# Altium schematic symbol library jlcpcb_2025_04_resistors_extended_2512.schlib: 2667 symbols (part 1 of 14) (continued)
## 25121WF220JT4E
designator R?  Resistance: 22Ω  (hidden comment: *)
Resistor, 22Ω, ±1%, 1W, 200V, ±200ppm/℃, -55℃~+155℃, SMD 2512; Manufacturer: Uniroyal; Manufacturer Part Number: 25121WF220JT4E; Supplier 1: LCSC; Supplier Part Number 1: C118189; JLCPCB Part Number: C118189; Power Rating: 1W; Category: Resistors; Package Size: 2512; JLCPCB Basic Part: Yes; Tolerance: ±1%; Voltage Rating: 200V; Temperature Coefficient: ±200ppm/℃; Temperature Rating: -55℃~+155℃; ComponentLink1Description: Datasheet; ComponentLink1URL: https://wmsc.lcsc.com/wmsc/upload/file/pdf/v2/lcsc/2205312316_UNI-ROYAL-Uniroyal-Elec-25121WF220JT4E_C118189.pdf; ComponentLink2Description: JLCPCB Part URL; ComponentLink2URL: https://jlcpcb.com/partdetail/C118189
pins: 1, 2
1 alternate drawing of the same symbol

## 25121WF220KT4E
designator R?  Resistance: 2.2Ω  (hidden comment: *)
Resistor, 2.2Ω, ±1%, 1W, 200V, ±200ppm/℃, -55℃~+155℃, SMD 2512; Manufacturer: Uniroyal; Manufacturer Part Number: 25121WF220KT4E; Supplier 1: LCSC; Supplier Part Number 1: C620867; JLCPCB Part Number: C620867; Power Rating: 1W; Category: Resistors; Package Size: 2512; JLCPCB Basic Part: Yes; Tolerance: ±1%; Voltage Rating: 200V; Temperature Coefficient: ±200ppm/℃; Temperature Rating: -55℃~+155℃; ComponentLink1Description: Datasheet; ComponentLink1URL: https://wmsc.lcsc.com/wmsc/upload/file/pdf/v2/lcsc/2205311816_UNI-ROYAL-Uniroyal-Elec-25121WF220KT4E_C620867.pdf; ComponentLink2Description: JLCPCB Part URL; ComponentLink2URL: https://jlcpcb.com/partdetail/C620867
pins: 1, 2
1 alternate drawing of the same symbol

## 25121WF220MT4E
designator R?  Resistance: 22mΩ  (hidden comment: *)
Resistor, 22mΩ, ±1%, 1W, 200V, ±1000ppm/℃, -55℃~+155℃, SMD 2512; Manufacturer: Uniroyal; Manufacturer Part Number: 25121WF220MT4E; Supplier 1: LCSC; Supplier Part Number 1: C921013; JLCPCB Part Number: C921013; Power Rating: 1W; Category: Resistors; Package Size: 2512; JLCPCB Basic Part: Yes; Tolerance: ±1%; Voltage Rating: 200V; Temperature Coefficient: ±1000ppm/℃; Temperature Rating: -55℃~+155℃; ComponentLink1Description: Datasheet; ComponentLink1URL: https://wmsc.lcsc.com/wmsc/upload/file/pdf/v2/lcsc/2206011045_UNI-ROYAL-Uniroyal-Elec-25121WF220MT4E_C921013.pdf; ComponentLink2Description: JLCPCB Part URL; ComponentLink2URL: https://jlcpcb.com/partdetail/C921013
pins: 1, 2
1 alternate drawing of the same symbol

## 25121WF221JT4E
designator R?  Resistance: 22.1Ω  (hidden comment: *)
Resistor, 22.1Ω, ±1%, 1W, 200V, ±100ppm/℃, -55℃~+155℃, SMD 2512; Manufacturer: Uniroyal; Manufacturer Part Number: 25121WF221JT4E; Supplier 1: LCSC; Supplier Part Number 1: C421606; JLCPCB Part Number: C421606; Power Rating: 1W; Category: Resistors; Package Size: 2512; JLCPCB Basic Part: Yes; Tolerance: ±1%; Voltage Rating: 200V; Temperature Coefficient: ±100ppm/℃; Temperature Rating: -55℃~+155℃; ComponentLink1Description: Datasheet; ComponentLink1URL: https://wmsc.lcsc.com/wmsc/upload/file/pdf/v2/lcsc/2205312000_UNI-ROYAL-Uniroyal-Elec-25121WF221JT4E_C421606.pdf; ComponentLink2Description: JLCPCB Part URL; ComponentLink2URL: https://jlcpcb.com/partdetail/C421606
pins: 1, 2
1 alternate drawing of the same symbol

## 25121WF232JT4E
designator R?  Resistance: 23.2Ω  (hidden comment: *)
Resistor, 23.2Ω, ±1%, 1W, 200V, ±100ppm/℃, -55℃~+155℃, SMD 2512; Manufacturer: Uniroyal; Manufacturer Part Number: 25121WF232JT4E; Supplier 1: LCSC; Supplier Part Number 1: C421603; JLCPCB Part Number: C421603; Power Rating: 1W; Category: Resistors; Package Size: 2512; JLCPCB Basic Part: Yes; Tolerance: ±1%; Voltage Rating: 200V; Temperature Coefficient: ±100ppm/℃; Temperature Rating: -55℃~+155℃; ComponentLink1Description: Datasheet; ComponentLink1URL: https://wmsc.lcsc.com/wmsc/upload/file/pdf/v2/lcsc/2205312000_UNI-ROYAL-Uniroyal-Elec-25121WF232JT4E_C421603.pdf; ComponentLink2Description: JLCPCB Part URL; ComponentLink2URL: https://jlcpcb.com/partdetail/C421603
pins: 1, 2
1 alternate drawing of the same symbol

## 25121WF237JT4E
designator R?  Resistance: 23.7Ω  (hidden comment: *)
Resistor, 23.7Ω, ±1%, 1W, 200V, ±100ppm/℃, -55℃~+155℃, SMD 2512; Manufacturer: Uniroyal; Manufacturer Part Number: 25121WF237JT4E; Supplier 1: LCSC; Supplier Part Number 1: C421601; JLCPCB Part Number: C421601; Power Rating: 1W; Category: Resistors; Package Size: 2512; JLCPCB Basic Part: Yes; Tolerance: ±1%; Voltage Rating: 200V; Temperature Coefficient: ±100ppm/℃; Temperature Rating: -55℃~+155℃; ComponentLink1Description: Datasheet; ComponentLink1URL: https://wmsc.lcsc.com/wmsc/upload/file/pdf/v2/lcsc/2205312000_UNI-ROYAL-Uniroyal-Elec-25121WF237JT4E_C421601.pdf; ComponentLink2Description: JLCPCB Part URL; ComponentLink2URL: https://jlcpcb.com/partdetail/C421601
pins: 1, 2
1 alternate drawing of the same symbol

## 25121WF240JT4E
designator R?  Resistance: 24Ω  (hidden comment: *)
Resistor, 24Ω, ±1%, 1W, 200V, ±200ppm/℃, -55℃~+155℃, SMD 2512; Manufacturer: Uniroyal; Manufacturer Part Number: 25121WF240JT4E; Supplier 1: LCSC; Supplier Part Number 1: C107659; JLCPCB Part Number: C107659; Power Rating: 1W; Category: Resistors; Package Size: 2512; JLCPCB Basic Part: Yes; Tolerance: ±1%; Voltage Rating: 200V; Temperature Coefficient: ±200ppm/℃; Temperature Rating: -55℃~+155℃; ComponentLink1Description: Datasheet; ComponentLink1URL: https://wmsc.lcsc.com/wmsc/upload/file/pdf/v2/lcsc/2205312316_UNI-ROYAL-Uniroyal-Elec-25121WF240JT4E_C107659.pdf; ComponentLink2Description: JLCPCB Part URL; ComponentLink2URL: https://jlcpcb.com/partdetail/C107659
pins: 1, 2
1 alternate drawing of the same symbol

## 25121WF240KT4E
designator R?  Resistance: 2.4Ω  (hidden comment: *)
Resistor, 2.4Ω, ±1%, 1W, 200V, ±200ppm/℃, -55℃~+155℃, SMD 2512; Manufacturer: Uniroyal; Manufacturer Part Number: 25121WF240KT4E; Supplier 1: LCSC; Supplier Part Number 1: C620868; JLCPCB Part Number: C620868; Power Rating: 1W; Category: Resistors; Package Size: 2512; JLCPCB Basic Part: Yes; Tolerance: ±1%; Voltage Rating: 200V; Temperature Coefficient: ±200ppm/℃; Temperature Rating: -55℃~+155℃; ComponentLink1Description: Datasheet; ComponentLink1URL: https://wmsc.lcsc.com/wmsc/upload/file/pdf/v2/lcsc/2205311816_UNI-ROYAL-Uniroyal-Elec-25121WF240KT4E_C620868.pdf; ComponentLink2Description: JLCPCB Part URL; ComponentLink2URL: https://jlcpcb.com/partdetail/C620868
pins: 1, 2
1 alternate drawing of the same symbol

## 25121WF249JT4E
designator R?  Resistance: 24.9Ω  (hidden comment: *)
Resistor, 24.9Ω, ±1%, 1W, 200V, ±100ppm/℃, -55℃~+155℃, SMD 2512; Manufacturer: Uniroyal; Manufacturer Part Number: 25121WF249JT4E; Supplier 1: LCSC; Supplier Part Number 1: C421595; JLCPCB Part Number: C421595; Power Rating: 1W; Category: Resistors; Package Size: 2512; JLCPCB Basic Part: Yes; Tolerance: ±1%; Voltage Rating: 200V; Temperature Coefficient: ±100ppm/℃; Temperature Rating: -55℃~+155℃; ComponentLink1Description: Datasheet; ComponentLink1URL: https://wmsc.lcsc.com/wmsc/upload/file/pdf/v2/lcsc/2205312000_UNI-ROYAL-Uniroyal-Elec-25121WF249JT4E_C421595.pdf; ComponentLink2Description: JLCPCB Part URL; ComponentLink2URL: https://jlcpcb.com/partdetail/C421595
pins: 1, 2
1 alternate drawing of the same symbol

## 25121WF250LT4E
designator R?  Resistance: 250mΩ  (hidden comment: *)
Resistor, 250mΩ, ±1%, 1W, 200V, ±800ppm/℃, -55℃~+155℃, SMD 2512; Manufacturer: Uniroyal; Manufacturer Part Number: 25121WF250LT4E; Supplier 1: LCSC; Supplier Part Number 1: C25467; JLCPCB Part Number: C25467; Power Rating: 1W; Category: Resistors; Package Size: 2512; JLCPCB Basic Part: Yes; Tolerance: ±1%; Voltage Rating: 200V; Temperature Coefficient: ±800ppm/℃; Temperature Rating: -55℃~+155℃; ComponentLink1Description: Datasheet; ComponentLink1URL: https://wmsc.lcsc.com/wmsc/upload/file/pdf/v2/lcsc/2205311845_UNI-ROYAL-Uniroyal-Elec-25121WF250LT4E_C25467.pdf; ComponentLink2Description: JLCPCB Part URL; ComponentLink2URL: https://jlcpcb.com/partdetail/C25467
pins: 1, 2
1 alternate drawing of the same symbol

## 25121WF255KT4E
designator R?  Resistance: 2.55Ω  (hidden comment: *)
Resistor, 2.55Ω, ±1%, 1W, 200V, ±400ppm/℃, -55℃~+155℃, SMD 2512; Manufacturer: Uniroyal; Manufacturer Part Number: 25121WF255KT4E; Supplier 1: LCSC; Supplier Part Number 1: C406948; JLCPCB Part Number: C406948; Power Rating: 1W; Category: Resistors; Package Size: 2512; JLCPCB Basic Part: Yes; Tolerance: ±1%; Voltage Rating: 200V; Temperature Coefficient: ±400ppm/℃; Temperature Rating: -55℃~+155℃; ComponentLink1Description: Datasheet; ComponentLink1URL: https://wmsc.lcsc.com/wmsc/upload/file/pdf/v2/lcsc/2205312300_UNI-ROYAL-Uniroyal-Elec-25121WF255KT4E_C406948.pdf; ComponentLink2Description: JLCPCB Part URL; ComponentLink2URL: https://jlcpcb.com/partdetail/C406948
pins: 1, 2
1 alternate drawing of the same symbol

## 25121WF270JT4E
designator R?  Resistance: 27Ω  (hidden comment: *)
Resistor, 27Ω, ±1%, 1W, 200V, ±100ppm/℃, -55℃~+155℃, SMD 2512; Manufacturer: Uniroyal; Manufacturer Part Number: 25121WF270JT4E; Supplier 1: LCSC; Supplier Part Number 1: C620875; JLCPCB Part Number: C620875; Power Rating: 1W; Category: Resistors; Package Size: 2512; JLCPCB Basic Part: Yes; Tolerance: ±1%; Voltage Rating: 200V; Temperature Coefficient: ±100ppm/℃; Temperature Rating: -55℃~+155℃; ComponentLink1Description: Datasheet; ComponentLink1URL: https://wmsc.lcsc.com/wmsc/upload/file/pdf/v2/lcsc/2205311816_UNI-ROYAL-Uniroyal-Elec-25121WF270JT4E_C620875.pdf; ComponentLink2Description: JLCPCB Part URL; ComponentLink2URL: https://jlcpcb.com/partdetail/C620875
pins: 1, 2
1 alternate drawing of the same symbol

## 25121WF270KT4E
designator R?  Resistance: 2.7Ω  (hidden comment: *)
Resistor, 2.7Ω, ±1%, 1W, 200V, ±200ppm/℃, -55℃~+155℃, SMD 2512; Manufacturer: Uniroyal; Manufacturer Part Number: 25121WF270KT4E; Supplier 1: LCSC; Supplier Part Number 1: C620870; JLCPCB Part Number: C620870; Power Rating: 1W; Category: Resistors; Package Size: 2512; JLCPCB Basic Part: Yes; Tolerance: ±1%; Voltage Rating: 200V; Temperature Coefficient: ±200ppm/℃; Temperature Rating: -55℃~+155℃; ComponentLink1Description: Datasheet; ComponentLink1URL: https://wmsc.lcsc.com/wmsc/upload/file/pdf/v2/lcsc/2205311816_UNI-ROYAL-Uniroyal-Elec-25121WF270KT4E_C620870.pdf; ComponentLink2Description: JLCPCB Part URL; ComponentLink2URL: https://jlcpcb.com/partdetail/C620870
pins: 1, 2
1 alternate drawing of the same symbol

## 25121WF270LT4E
designator R?  Resistance: 270mΩ  (hidden comment: *)
Resistor, 270mΩ, ±1%, 1W, 200V, ±800ppm/℃, -55℃~+155℃, SMD 2512; Manufacturer: Uniroyal; Manufacturer Part Number: 25121WF270LT4E; Supplier 1: LCSC; Supplier Part Number 1: C474286; JLCPCB Part Number: C474286; Power Rating: 1W; Category: Resistors; Package Size: 2512; JLCPCB Basic Part: Yes; Tolerance: ±1%; Voltage Rating: 200V; Temperature Coefficient: ±800ppm/℃; Temperature Rating: -55℃~+155℃; ComponentLink1Description: Datasheet; ComponentLink1URL: https://wmsc.lcsc.com/wmsc/upload/file/pdf/v2/lcsc/2206011100_UNI-ROYAL-Uniroyal-Elec-25121WF270LT4E_C474286.pdf; ComponentLink2Description: JLCPCB Part URL; ComponentLink2URL: https://jlcpcb.com/partdetail/C474286
pins: 1, 2
1 alternate drawing of the same symbol

## 25121WF280KT4E
designator R?  Resistance: 2.8Ω  (hidden comment: *)
Resistor, 2.8Ω, ±1%, 1W, 200V, ±200ppm/℃, -55℃~+155℃, SMD 2512; Manufacturer: Uniroyal; Manufacturer Part Number: 25121WF280KT4E; Supplier 1: LCSC; Supplier Part Number 1: C784337; JLCPCB Part Number: C784337; Power Rating: 1W; Category: Resistors; Package Size: 2512; JLCPCB Basic Part: Yes; Tolerance: ±1%; Voltage Rating: 200V; Temperature Coefficient: ±200ppm/℃; Temperature Rating: -55℃~+155℃; ComponentLink1Description: Datasheet; ComponentLink1URL: https://wmsc.lcsc.com/wmsc/upload/file/pdf/v2/lcsc/2206011045_UNI-ROYAL-Uniroyal-Elec-25121WF280KT4E_C784337.pdf; ComponentLink2Description: JLCPCB Part URL; ComponentLink2URL: https://jlcpcb.com/partdetail/C784337
pins: 1, 2
1 alternate drawing of the same symbol

## 25121WF280LT4E
designator R?  Resistance: 280mΩ  (hidden comment: *)
Resistor, 280mΩ, ±1%, 1W, 200V, ±800ppm/℃, -55℃~+155℃, SMD 2512; Manufacturer: Uniroyal; Manufacturer Part Number: 25121WF280LT4E; Supplier 1: LCSC; Supplier Part Number 1: C421584; JLCPCB Part Number: C421584; Power Rating: 1W; Category: Resistors; Package Size: 2512; JLCPCB Basic Part: Yes; Tolerance: ±1%; Voltage Rating: 200V; Temperature Coefficient: ±800ppm/℃; Temperature Rating: -55℃~+155℃; ComponentLink1Description: Datasheet; ComponentLink1URL: https://wmsc.lcsc.com/wmsc/upload/file/pdf/v2/lcsc/2205312000_UNI-ROYAL-Uniroyal-Elec-25121WF280LT4E_C421584.pdf; ComponentLink2Description: JLCPCB Part URL; ComponentLink2URL: https://jlcpcb.com/partdetail/C421584
pins: 1, 2
1 alternate drawing of the same symbol

## 25121WF300JT4E
designator R?  Resistance: 30Ω  (hidden comment: *)
Resistor, 30Ω, ±1%, 1W, 200V, ±100ppm/℃, -55℃~+155℃, SMD 2512; Manufacturer: Uniroyal; Manufacturer Part Number: 25121WF300JT4E; Supplier 1: LCSC; Supplier Part Number 1: C620878; JLCPCB Part Number: C620878; Power Rating: 1W; Category: Resistors; Package Size: 2512; JLCPCB Basic Part: Yes; Tolerance: ±1%; Voltage Rating: 200V; Temperature Coefficient: ±100ppm/℃; Temperature Rating: -55℃~+155℃; ComponentLink1Description: Datasheet; ComponentLink1URL: https://wmsc.lcsc.com/wmsc/upload/file/pdf/v2/lcsc/2205311816_UNI-ROYAL-Uniroyal-Elec-25121WF300JT4E_C620878.pdf; ComponentLink2Description: JLCPCB Part URL; ComponentLink2URL: https://jlcpcb.com/partdetail/C620878
pins: 1, 2
1 alternate drawing of the same symbol

## 25121WF300KT4E
designator R?  Resistance: 3Ω  (hidden comment: *)
Resistor, 3Ω, ±1%, 1W, 200V, ±200ppm/℃, -55℃~+155℃, SMD 2512; Manufacturer: Uniroyal; Manufacturer Part Number: 25121WF300KT4E; Supplier 1: LCSC; Supplier Part Number 1: C69478; JLCPCB Part Number: C69478; Power Rating: 1W; Category: Resistors; Package Size: 2512; JLCPCB Basic Part: Yes; Tolerance: ±1%; Voltage Rating: 200V; Temperature Coefficient: ±200ppm/℃; Temperature Rating: -55℃~+155℃; ComponentLink1Description: Datasheet; ComponentLink1URL: https://wmsc.lcsc.com/wmsc/upload/file/pdf/v2/lcsc/2205312345_UNI-ROYAL-Uniroyal-Elec-25121WF300KT4E_C69478.pdf; ComponentLink2Description: JLCPCB Part URL; ComponentLink2URL: https://jlcpcb.com/partdetail/C69478
pins: 1, 2
1 alternate drawing of the same symbol

## 25121WF300LT4E
designator R?  Resistance: 300mΩ  (hidden comment: *)
Resistor, 300mΩ, ±1%, 1W, 200V, ±800ppm/℃, -55℃~+155℃, SMD 2512; Manufacturer: Uniroyal; Manufacturer Part Number: 25121WF300LT4E; Supplier 1: LCSC; Supplier Part Number 1: C474208; JLCPCB Part Number: C474208; Power Rating: 1W; Category: Resistors; Package Size: 2512; JLCPCB Basic Part: Yes; Tolerance: ±1%; Voltage Rating: 200V; Temperature Coefficient: ±800ppm/℃; Temperature Rating: -55℃~+155℃; ComponentLink1Description: Datasheet; ComponentLink1URL: https://wmsc.lcsc.com/wmsc/upload/file/pdf/v2/lcsc/2206011100_UNI-ROYAL-Uniroyal-Elec-25121WF300LT4E_C474208.pdf; ComponentLink2Description: JLCPCB Part URL; ComponentLink2URL: https://jlcpcb.com/partdetail/C474208
pins: 1, 2
1 alternate drawing of the same symbol

## 25121WF300MT4E
designator R?  Resistance: 30mΩ  (hidden comment: *)
Resistor, 30mΩ, ±1%, 1W, 200V, ±1000ppm/℃, -55℃~+155℃, SMD 2512; Manufacturer: Uniroyal; Manufacturer Part Number: 25121WF300MT4E; Supplier 1: LCSC; Supplier Part Number 1: C474207; JLCPCB Part Number: C474207; Power Rating: 1W; Category: Resistors; Package Size: 2512; JLCPCB Basic Part: Yes; Tolerance: ±1%; Voltage Rating: 200V; Temperature Coefficient: ±1000ppm/℃; Temperature Rating: -55℃~+155℃; ComponentLink1Description: Datasheet; ComponentLink1URL: https://wmsc.lcsc.com/wmsc/upload/file/pdf/v2/lcsc/2206011100_UNI-ROYAL-Uniroyal-Elec-25121WF300MT4E_C474207.pdf; ComponentLink2Description: JLCPCB Part URL; ComponentLink2URL: https://jlcpcb.com/partdetail/C474207
pins: 1, 2
1 alternate drawing of the same symbol

## 25121WF301KT4E
designator R?  Resistance: 3.01Ω  (hidden comment: *)
Resistor, 3.01Ω, ±1%, 1W, 200V, ±200ppm/℃, -55℃~+155℃, SMD 2512; Manufacturer: Uniroyal; Manufacturer Part Number: 25121WF301KT4E; Supplier 1: LCSC; Supplier Part Number 1: C406945; JLCPCB Part Number: C406945; Power Rating: 1W; Category: Resistors; Package Size: 2512; JLCPCB Basic Part: Yes; Tolerance: ±1%; Voltage Rating: 200V; Temperature Coefficient: ±200ppm/℃; Temperature Rating: -55℃~+155℃; ComponentLink1Description: Datasheet; ComponentLink1URL: https://wmsc.lcsc.com/wmsc/upload/file/pdf/v2/lcsc/2205312300_UNI-ROYAL-Uniroyal-Elec-25121WF301KT4E_C406945.pdf; ComponentLink2Description: JLCPCB Part URL; ComponentLink2URL: https://jlcpcb.com/partdetail/C406945
pins: 1, 2
1 alternate drawing of the same symbol

## 25121WF330JT4E
designator R?  Resistance: 33Ω  (hidden comment: *)
Resistor, 33Ω, ±1%, 1W, 200V, ±200ppm/℃, -55℃~+155℃, SMD 2512; Manufacturer: Uniroyal; Manufacturer Part Number: 25121WF330JT4E; Supplier 1: LCSC; Supplier Part Number 1: C53728; JLCPCB Part Number: C53728; Power Rating: 1W; Category: Resistors; Package Size: 2512; JLCPCB Basic Part: Yes; Tolerance: ±1%; Voltage Rating: 200V; Temperature Coefficient: ±200ppm/℃; Temperature Rating: -55℃~+155℃; ComponentLink1Description: Datasheet; ComponentLink1URL: https://wmsc.lcsc.com/wmsc/upload/file/pdf/v2/lcsc/2206010000_UNI-ROYAL-Uniroyal-Elec-25121WF330JT4E_C53728.pdf; ComponentLink2Description: JLCPCB Part URL; ComponentLink2URL: https://jlcpcb.com/partdetail/C53728
pins: 1, 2
1 alternate drawing of the same symbol

## 25121WF330KT4E
designator R?  Resistance: 3.3Ω  (hidden comment: *)
Resistor, 3.3Ω, ±1%, 1W, 200V, ±200ppm/℃, -55℃~+155℃, SMD 2512; Manufacturer: Uniroyal; Manufacturer Part Number: 25121WF330KT4E; Supplier 1: LCSC; Supplier Part Number 1: C39347; JLCPCB Part Number: C39347; Power Rating: 1W; Category: Resistors; Package Size: 2512; JLCPCB Basic Part: Yes; Tolerance: ±1%; Voltage Rating: 200V; Temperature Coefficient: ±200ppm/℃; Temperature Rating: -55℃~+155℃; ComponentLink1Description: Datasheet; ComponentLink1URL: https://wmsc.lcsc.com/wmsc/upload/file/pdf/v2/lcsc/2206010000_UNI-ROYAL-Uniroyal-Elec-25121WF330KT4E_C39347.pdf; ComponentLink2Description: JLCPCB Part URL; ComponentLink2URL: https://jlcpcb.com/partdetail/C39347
pins: 1, 2
1 alternate drawing of the same symbol

## 25121WF330LT4E
designator R?  Resistance: 330mΩ  (hidden comment: *)
Resistor, 330mΩ, ±1%, 1W, 200V, ±800ppm/℃, -55℃~+155℃, SMD 2512; Manufacturer: Uniroyal; Manufacturer Part Number: 25121WF330LT4E; Supplier 1: LCSC; Supplier Part Number 1: C25468; JLCPCB Part Number: C25468; Power Rating: 1W; Category: Resistors; Package Size: 2512; JLCPCB Basic Part: Yes; Tolerance: ±1%; Voltage Rating: 200V; Temperature Coefficient: ±800ppm/℃; Temperature Rating: -55℃~+155℃; ComponentLink1Description: Datasheet; ComponentLink1URL: https://wmsc.lcsc.com/wmsc/upload/file/pdf/v2/lcsc/2205311845_UNI-ROYAL-Uniroyal-Elec-25121WF330LT4E_C25468.pdf; ComponentLink2Description: JLCPCB Part URL; ComponentLink2URL: https://jlcpcb.com/partdetail/C25468
pins: 1, 2
1 alternate drawing of the same symbol

## 25121WF332JT4E
designator R?  Resistance: 33.2Ω  (hidden comment: *)
Resistor, 33.2Ω, ±1%, 1W, 200V, ±100ppm/℃, -55℃~+155℃, SMD 2512; Manufacturer: Uniroyal; Manufacturer Part Number: 25121WF332JT4E; Supplier 1: LCSC; Supplier Part Number 1: C421578; JLCPCB Part Number: C421578; Power Rating: 1W; Category: Resistors; Package Size: 2512; JLCPCB Basic Part: Yes; Tolerance: ±1%; Voltage Rating: 200V; Temperature Coefficient: ±100ppm/℃; Temperature Rating: -55℃~+155℃; ComponentLink1Description: Datasheet; ComponentLink1URL: https://wmsc.lcsc.com/wmsc/upload/file/pdf/v2/lcsc/2205312000_UNI-ROYAL-Uniroyal-Elec-25121WF332JT4E_C421578.pdf; ComponentLink2Description: JLCPCB Part URL; ComponentLink2URL: https://jlcpcb.com/partdetail/C421578
pins: 1, 2
1 alternate drawing of the same symbol

## 25121WF340JT4E
designator R?  Resistance: 34Ω  (hidden comment: *)
Resistor, 34Ω, ±1%, 1W, 200V, ±100ppm/℃, -55℃~+155℃, SMD 2512; Manufacturer: Uniroyal; Manufacturer Part Number: 25121WF340JT4E; Supplier 1: LCSC; Supplier Part Number 1: C421576; JLCPCB Part Number: C421576; Power Rating: 1W; Category: Resistors; Package Size: 2512; JLCPCB Basic Part: Yes; Tolerance: ±1%; Voltage Rating: 200V; Temperature Coefficient: ±100ppm/℃; Temperature Rating: -55℃~+155℃; ComponentLink1Description: Datasheet; ComponentLink1URL: https://wmsc.lcsc.com/wmsc/upload/file/pdf/v2/lcsc/2205312000_UNI-ROYAL-Uniroyal-Elec-25121WF340JT4E_C421576.pdf; ComponentLink2Description: JLCPCB Part URL; ComponentLink2URL: https://jlcpcb.com/partdetail/C421576
pins: 1, 2
1 alternate drawing of the same symbol

## 25121WF348JT4E
designator R?  Resistance: 34.8Ω  (hidden comment: *)
Resistor, 34.8Ω, ±1%, 1W, 200V, ±100ppm/℃, -55℃~+155℃, SMD 2512; Manufacturer: Uniroyal; Manufacturer Part Number: 25121WF348JT4E; Supplier 1: LCSC; Supplier Part Number 1: C421574; JLCPCB Part Number: C421574; Power Rating: 1W; Category: Resistors; Package Size: 2512; JLCPCB Basic Part: Yes; Tolerance: ±1%; Voltage Rating: 200V; Temperature Coefficient: ±100ppm/℃; Temperature Rating: -55℃~+155℃; ComponentLink1Description: Datasheet; ComponentLink1URL: https://wmsc.lcsc.com/wmsc/upload/file/pdf/v2/lcsc/2205312000_UNI-ROYAL-Uniroyal-Elec-25121WF348JT4E_C421574.pdf; ComponentLink2Description: JLCPCB Part URL; ComponentLink2URL: https://jlcpcb.com/partdetail/C421574
pins: 1, 2
1 alternate drawing of the same symbol

## 25121WF357JT4E
designator R?  Resistance: 35.7Ω  (hidden comment: *)
Resistor, 35.7Ω, ±1%, 1W, 200V, ±100ppm/℃, -55℃~+155℃, SMD 2512; Manufacturer: Uniroyal; Manufacturer Part Number: 25121WF357JT4E; Supplier 1: LCSC; Supplier Part Number 1: C421573; JLCPCB Part Number: C421573; Power Rating: 1W; Category: Resistors; Package Size: 2512; JLCPCB Basic Part: Yes; Tolerance: ±1%; Voltage Rating: 200V; Temperature Coefficient: ±100ppm/℃; Temperature Rating: -55℃~+155℃; ComponentLink1Description: Datasheet; ComponentLink1URL: https://wmsc.lcsc.com/wmsc/upload/file/pdf/v2/lcsc/2205312000_UNI-ROYAL-Uniroyal-Elec-25121WF357JT4E_C421573.pdf; ComponentLink2Description: JLCPCB Part URL; ComponentLink2URL: https://jlcpcb.com/partdetail/C421573
pins: 1, 2
1 alternate drawing of the same symbol

## 25121WF360JT4E
designator R?  Resistance: 36Ω  (hidden comment: *)
Resistor, 36Ω, ±1%, 1W, 200V, ±200ppm/℃, -55℃~+155℃, SMD 2512; Manufacturer: Uniroyal; Manufacturer Part Number: 25121WF360JT4E; Supplier 1: LCSC; Supplier Part Number 1: C190228; JLCPCB Part Number: C190228; Power Rating: 1W; Category: Resistors; Package Size: 2512; JLCPCB Basic Part: Yes; Tolerance: ±1%; Voltage Rating: 200V; Temperature Coefficient: ±200ppm/℃; Temperature Rating: -55℃~+155℃; ComponentLink1Description: Datasheet; ComponentLink1URL: https://wmsc.lcsc.com/wmsc/upload/file/pdf/v2/lcsc/2205312316_UNI-ROYAL-Uniroyal-Elec-25121WF360JT4E_C190228.pdf; ComponentLink2Description: JLCPCB Part URL; ComponentLink2URL: https://jlcpcb.com/partdetail/C190228
pins: 1, 2
1 alternate drawing of the same symbol

## 25121WF360KT4E
designator R?  Resistance: 3.6Ω  (hidden comment: *)
Resistor, 3.6Ω, ±1%, 1W, 200V, ±200ppm/℃, -55℃~+155℃, SMD 2512; Manufacturer: Uniroyal; Manufacturer Part Number: 25121WF360KT4E; Supplier 1: LCSC; Supplier Part Number 1: C55502; JLCPCB Part Number: C55502; Power Rating: 1W; Category: Resistors; Package Size: 2512; JLCPCB Basic Part: Yes; Tolerance: ±1%; Voltage Rating: 200V; Temperature Coefficient: ±200ppm/℃; Temperature Rating: -55℃~+155℃; ComponentLink1Description: Datasheet; ComponentLink1URL: https://wmsc.lcsc.com/wmsc/upload/file/pdf/v2/lcsc/2205312345_UNI-ROYAL-Uniroyal-Elec-25121WF360KT4E_C55502.pdf; ComponentLink2Description: JLCPCB Part URL; ComponentLink2URL: https://jlcpcb.com/partdetail/C55502
pins: 1, 2
1 alternate drawing of the same symbol

## 25121WF360LT4E
designator R?  Resistance: 360mΩ  (hidden comment: *)
Resistor, 360mΩ, ±1%, 1W, 200V, ±800ppm/℃, -55℃~+155℃, SMD 2512; Manufacturer: Uniroyal; Manufacturer Part Number: 25121WF360LT4E; Supplier 1: LCSC; Supplier Part Number 1: C168925; JLCPCB Part Number: C168925; Power Rating: 1W; Category: Resistors; Package Size: 2512; JLCPCB Basic Part: Yes; Tolerance: ±1%; Voltage Rating: 200V; Temperature Coefficient: ±800ppm/℃; Temperature Rating: -55℃~+155℃; ComponentLink1Description: Datasheet; ComponentLink1URL: https://wmsc.lcsc.com/wmsc/upload/file/pdf/v2/lcsc/2205312316_UNI-ROYAL-Uniroyal-Elec-25121WF360LT4E_C168925.pdf; ComponentLink2Description: JLCPCB Part URL; ComponentLink2URL: https://jlcpcb.com/partdetail/C168925
pins: 1, 2
1 alternate drawing of the same symbol

## 25121WF374JT4E
designator R?  Resistance: 37.4Ω  (hidden comment: *)
Resistor, 37.4Ω, ±1%, 1W, 200V, ±100ppm/℃, -55℃~+155℃, SMD 2512; Manufacturer: Uniroyal; Manufacturer Part Number: 25121WF374JT4E; Supplier 1: LCSC; Supplier Part Number 1: C421567; JLCPCB Part Number: C421567; Power Rating: 1W; Category: Resistors; Package Size: 2512; JLCPCB Basic Part: Yes; Tolerance: ±1%; Voltage Rating: 200V; Temperature Coefficient: ±100ppm/℃; Temperature Rating: -55℃~+155℃; ComponentLink1Description: Datasheet; ComponentLink1URL: https://wmsc.lcsc.com/wmsc/upload/file/pdf/v2/lcsc/2205312000_UNI-ROYAL-Uniroyal-Elec-25121WF374JT4E_C421567.pdf; ComponentLink2Description: JLCPCB Part URL; ComponentLink2URL: https://jlcpcb.com/partdetail/C421567
pins: 1, 2
1 alternate drawing of the same symbol

## 25121WF383JT4E
designator R?  Resistance: 38.3Ω  (hidden comment: *)
Resistor, 38.3Ω, ±1%, 1W, 200V, ±100ppm/℃, -55℃~+155℃, SMD 2512; Manufacturer: Uniroyal; Manufacturer Part Number: 25121WF383JT4E; Supplier 1: LCSC; Supplier Part Number 1: C421565; JLCPCB Part Number: C421565; Power Rating: 1W; Category: Resistors; Package Size: 2512; JLCPCB Basic Part: Yes; Tolerance: ±1%; Voltage Rating: 200V; Temperature Coefficient: ±100ppm/℃; Temperature Rating: -55℃~+155℃; ComponentLink1Description: Datasheet; ComponentLink1URL: https://wmsc.lcsc.com/wmsc/upload/file/pdf/v2/lcsc/2205312000_UNI-ROYAL-Uniroyal-Elec-25121WF383JT4E_C421565.pdf; ComponentLink2Description: JLCPCB Part URL; ComponentLink2URL: https://jlcpcb.com/partdetail/C421565
pins: 1, 2
1 alternate drawing of the same symbol

## 25121WF390JT4E
designator R?  Resistance: 39Ω  (hidden comment: *)
Resistor, 39Ω, ±1%, 1W, 200V, ±100ppm/℃, -55℃~+155℃, SMD 2512; Manufacturer: Uniroyal; Manufacturer Part Number: 25121WF390JT4E; Supplier 1: LCSC; Supplier Part Number 1: C109426; JLCPCB Part Number: C109426; Power Rating: 1W; Category: Resistors; Package Size: 2512; JLCPCB Basic Part: Yes; Tolerance: ±1%; Voltage Rating: 200V; Temperature Coefficient: ±100ppm/℃; Temperature Rating: -55℃~+155℃; ComponentLink1Description: Datasheet; ComponentLink1URL: https://wmsc.lcsc.com/wmsc/upload/file/pdf/v2/lcsc/2205312316_UNI-ROYAL-Uniroyal-Elec-25121WF390JT4E_C109426.pdf; ComponentLink2Description: JLCPCB Part URL; ComponentLink2URL: https://jlcpcb.com/partdetail/C109426
pins: 1, 2
1 alternate drawing of the same symbol

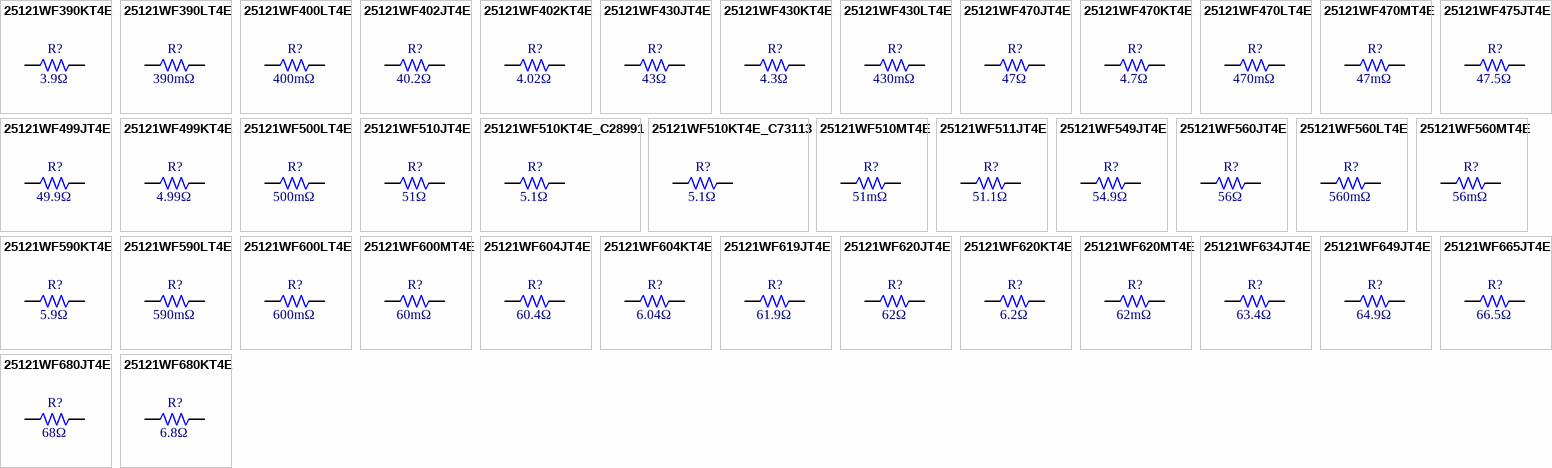
[diagram p2: symbols 25121WF390KT4E to 25121WF680KT4E]

## 25121WF390KT4E
designator R?  Resistance: 3.9Ω  (hidden comment: *)
Resistor, 3.9Ω, ±1%, 1W, 200V, ±200ppm/℃, -55℃~+155℃, SMD 2512; Manufacturer: Uniroyal; Manufacturer Part Number: 25121WF390KT4E; Supplier 1: LCSC; Supplier Part Number 1: C39356; JLCPCB Part Number: C39356; Power Rating: 1W; Category: Resistors; Package Size: 2512; JLCPCB Basic Part: Yes; Tolerance: ±1%; Voltage Rating: 200V; Temperature Coefficient: ±200ppm/℃; Temperature Rating: -55℃~+155℃; ComponentLink1Description: Datasheet; ComponentLink1URL: https://wmsc.lcsc.com/wmsc/upload/file/pdf/v2/lcsc/2206010000_UNI-ROYAL-Uniroyal-Elec-25121WF390KT4E_C39356.pdf; ComponentLink2Description: JLCPCB Part URL; ComponentLink2URL: https://jlcpcb.com/partdetail/C39356
pins: 1, 2
1 alternate drawing of the same symbol

## 25121WF390LT4E
designator R?  Resistance: 390mΩ  (hidden comment: *)
Resistor, 390mΩ, ±1%, 1W, 200V, ±800ppm/℃, -55℃~+155℃, SMD 2512; Manufacturer: Uniroyal; Manufacturer Part Number: 25121WF390LT4E; Supplier 1: LCSC; Supplier Part Number 1: C60780; JLCPCB Part Number: C60780; Power Rating: 1W; Category: Resistors; Package Size: 2512; JLCPCB Basic Part: Yes; Tolerance: ±1%; Voltage Rating: 200V; Temperature Coefficient: ±800ppm/℃; Temperature Rating: -55℃~+155℃; ComponentLink1Description: Datasheet; ComponentLink1URL: https://wmsc.lcsc.com/wmsc/upload/file/pdf/v2/lcsc/2205312345_UNI-ROYAL-Uniroyal-Elec-25121WF390LT4E_C60780.pdf; ComponentLink2Description: JLCPCB Part URL; ComponentLink2URL: https://jlcpcb.com/partdetail/C60780
pins: 1, 2
1 alternate drawing of the same symbol

## 25121WF400LT4E
designator R?  Resistance: 400mΩ  (hidden comment: *)
Resistor, 400mΩ, ±1%, 1W, 200V, ±800ppm/℃, -55℃~+155℃, SMD 2512; Manufacturer: Uniroyal; Manufacturer Part Number: 25121WF400LT4E; Supplier 1: LCSC; Supplier Part Number 1: C421561; JLCPCB Part Number: C421561; Power Rating: 1W; Category: Resistors; Package Size: 2512; JLCPCB Basic Part: Yes; Tolerance: ±1%; Voltage Rating: 200V; Temperature Coefficient: ±800ppm/℃; Temperature Rating: -55℃~+155℃; ComponentLink1Description: Datasheet; ComponentLink1URL: https://wmsc.lcsc.com/wmsc/upload/file/pdf/v2/lcsc/2205312000_UNI-ROYAL-Uniroyal-Elec-25121WF400LT4E_C421561.pdf; ComponentLink2Description: JLCPCB Part URL; ComponentLink2URL: https://jlcpcb.com/partdetail/C421561
pins: 1, 2
1 alternate drawing of the same symbol

## 25121WF402JT4E
designator R?  Resistance: 40.2Ω  (hidden comment: *)
Resistor, 40.2Ω, ±1%, 1W, 200V, ±200ppm/℃, -55℃~+155℃, SMD 2512; Manufacturer: Uniroyal; Manufacturer Part Number: 25121WF402JT4E; Supplier 1: LCSC; Supplier Part Number 1: C406937; JLCPCB Part Number: C406937; Power Rating: 1W; Category: Resistors; Package Size: 2512; JLCPCB Basic Part: Yes; Tolerance: ±1%; Voltage Rating: 200V; Temperature Coefficient: ±200ppm/℃; Temperature Rating: -55℃~+155℃; ComponentLink1Description: Datasheet; ComponentLink1URL: https://wmsc.lcsc.com/wmsc/upload/file/pdf/v2/lcsc/2205312300_UNI-ROYAL-Uniroyal-Elec-25121WF402JT4E_C406937.pdf; ComponentLink2Description: JLCPCB Part URL; ComponentLink2URL: https://jlcpcb.com/partdetail/C406937
pins: 1, 2
1 alternate drawing of the same symbol

## 25121WF402KT4E
designator R?  Resistance: 4.02Ω  (hidden comment: *)
Resistor, 4.02Ω, ±1%, 1W, 200V, ±200ppm/℃, -55℃~+155℃, SMD 2512; Manufacturer: Uniroyal; Manufacturer Part Number: 25121WF402KT4E; Supplier 1: LCSC; Supplier Part Number 1: C421558; JLCPCB Part Number: C421558; Power Rating: 1W; Category: Resistors; Package Size: 2512; JLCPCB Basic Part: Yes; Tolerance: ±1%; Voltage Rating: 200V; Temperature Coefficient: ±200ppm/℃; Temperature Rating: -55℃~+155℃; ComponentLink1Description: Datasheet; ComponentLink1URL: https://wmsc.lcsc.com/wmsc/upload/file/pdf/v2/lcsc/2205312000_UNI-ROYAL-Uniroyal-Elec-25121WF402KT4E_C421558.pdf; ComponentLink2Description: JLCPCB Part URL; ComponentLink2URL: https://jlcpcb.com/partdetail/C421558
pins: 1, 2
1 alternate drawing of the same symbol

## 25121WF430JT4E
designator R?  Resistance: 43Ω  (hidden comment: *)
Resistor, 43Ω, ±1%, 1W, 200V, ±100ppm/℃, -55℃~+155℃, SMD 2512; Manufacturer: Uniroyal; Manufacturer Part Number: 25121WF430JT4E; Supplier 1: LCSC; Supplier Part Number 1: C620884; JLCPCB Part Number: C620884; Power Rating: 1W; Category: Resistors; Package Size: 2512; JLCPCB Basic Part: Yes; Tolerance: ±1%; Voltage Rating: 200V; Temperature Coefficient: ±100ppm/℃; Temperature Rating: -55℃~+155℃; ComponentLink1Description: Datasheet; ComponentLink1URL: https://wmsc.lcsc.com/wmsc/upload/file/pdf/v2/lcsc/2205311816_UNI-ROYAL-Uniroyal-Elec-25121WF430JT4E_C620884.pdf; ComponentLink2Description: JLCPCB Part URL; ComponentLink2URL: https://jlcpcb.com/partdetail/C620884
pins: 1, 2
1 alternate drawing of the same symbol

## 25121WF430KT4E
designator R?  Resistance: 4.3Ω  (hidden comment: *)
Resistor, 4.3Ω, ±1%, 1W, 200V, ±200ppm/℃, -55℃~+155℃, SMD 2512; Manufacturer: Uniroyal; Manufacturer Part Number: 25121WF430KT4E; Supplier 1: LCSC; Supplier Part Number 1: C48874; JLCPCB Part Number: C48874; Power Rating: 1W; Category: Resistors; Package Size: 2512; JLCPCB Basic Part: Yes; Tolerance: ±1%; Voltage Rating: 200V; Temperature Coefficient: ±200ppm/℃; Temperature Rating: -55℃~+155℃; ComponentLink1Description: Datasheet; ComponentLink1URL: https://wmsc.lcsc.com/wmsc/upload/file/pdf/v2/lcsc/2206010000_UNI-ROYAL-Uniroyal-Elec-25121WF430KT4E_C48874.pdf; ComponentLink2Description: JLCPCB Part URL; ComponentLink2URL: https://jlcpcb.com/partdetail/C48874
pins: 1, 2
1 alternate drawing of the same symbol

## 25121WF430LT4E
designator R?  Resistance: 430mΩ  (hidden comment: *)
Resistor, 430mΩ, ±1%, 1W, 200V, ±800ppm/℃, -55℃~+155℃, SMD 2512; Manufacturer: Uniroyal; Manufacturer Part Number: 25121WF430LT4E; Supplier 1: LCSC; Supplier Part Number 1: C620849; JLCPCB Part Number: C620849; Power Rating: 1W; Category: Resistors; Package Size: 2512; JLCPCB Basic Part: Yes; Tolerance: ±1%; Voltage Rating: 200V; Temperature Coefficient: ±800ppm/℃; Temperature Rating: -55℃~+155℃; ComponentLink1Description: Datasheet; ComponentLink1URL: https://wmsc.lcsc.com/wmsc/upload/file/pdf/v2/lcsc/2205311816_UNI-ROYAL-Uniroyal-Elec-25121WF430LT4E_C620849.pdf; ComponentLink2Description: JLCPCB Part URL; ComponentLink2URL: https://jlcpcb.com/partdetail/C620849
pins: 1, 2
1 alternate drawing of the same symbol

## 25121WF470JT4E
designator R?  Resistance: 47Ω  (hidden comment: *)
Resistor, 47Ω, ±1%, 1W, 200V, ±100ppm/℃, -55℃~+155℃, SMD 2512; Manufacturer: Uniroyal; Manufacturer Part Number: 25121WF470JT4E; Supplier 1: LCSC; Supplier Part Number 1: C474245; JLCPCB Part Number: C474245; Power Rating: 1W; Category: Resistors; Package Size: 2512; JLCPCB Basic Part: Yes; Tolerance: ±1%; Voltage Rating: 200V; Temperature Coefficient: ±100ppm/℃; Temperature Rating: -55℃~+155℃; ComponentLink1Description: Datasheet; ComponentLink1URL: https://wmsc.lcsc.com/wmsc/upload/file/pdf/v2/lcsc/2206011100_UNI-ROYAL-Uniroyal-Elec-25121WF470JT4E_C474245.pdf; ComponentLink2Description: JLCPCB Part URL; ComponentLink2URL: https://jlcpcb.com/partdetail/C474245
pins: 1, 2
1 alternate drawing of the same symbol

## 25121WF470KT4E
designator R?  Resistance: 4.7Ω  (hidden comment: *)
Resistor, 4.7Ω, ±1%, 1W, 200V, ±200ppm/℃, -55℃~+155℃, SMD 2512; Manufacturer: Uniroyal; Manufacturer Part Number: 25121WF470KT4E; Supplier 1: LCSC; Supplier Part Number 1: C474195; JLCPCB Part Number: C474195; Power Rating: 1W; Category: Resistors; Package Size: 2512; JLCPCB Basic Part: Yes; Tolerance: ±1%; Voltage Rating: 200V; Temperature Coefficient: ±200ppm/℃; Temperature Rating: -55℃~+155℃; ComponentLink1Description: Datasheet; ComponentLink1URL: https://wmsc.lcsc.com/wmsc/upload/file/pdf/v2/lcsc/2206011100_UNI-ROYAL-Uniroyal-Elec-25121WF470KT4E_C474195.pdf; ComponentLink2Description: JLCPCB Part URL; ComponentLink2URL: https://jlcpcb.com/partdetail/C474195
pins: 1, 2
1 alternate drawing of the same symbol

## 25121WF470LT4E
designator R?  Resistance: 470mΩ  (hidden comment: *)
Resistor, 470mΩ, ±1%, 1W, 200V, ±800ppm/℃, -55℃~+155℃, SMD 2512; Manufacturer: Uniroyal; Manufacturer Part Number: 25121WF470LT4E; Supplier 1: LCSC; Supplier Part Number 1: C21097; JLCPCB Part Number: C21097; Power Rating: 1W; Category: Resistors; Package Size: 2512; JLCPCB Basic Part: Yes; Tolerance: ±1%; Voltage Rating: 200V; Temperature Coefficient: ±800ppm/℃; Temperature Rating: -55℃~+155℃; ComponentLink1Description: Datasheet; ComponentLink1URL: https://wmsc.lcsc.com/wmsc/upload/file/pdf/v2/lcsc/2206010130_UNI-ROYAL-Uniroyal-Elec-25121WF470LT4E_C21097.pdf; ComponentLink2Description: JLCPCB Part URL; ComponentLink2URL: https://jlcpcb.com/partdetail/C21097
pins: 1, 2
1 alternate drawing of the same symbol

## 25121WF470MT4E
designator R?  Resistance: 47mΩ  (hidden comment: *)
Resistor, 47mΩ, ±1%, 1W, 200V, ±800ppm/℃, -55℃~+155℃, SMD 2512; Manufacturer: Uniroyal; Manufacturer Part Number: 25121WF470MT4E; Supplier 1: LCSC; Supplier Part Number 1: C406935; JLCPCB Part Number: C406935; Power Rating: 1W; Category: Resistors; Package Size: 2512; JLCPCB Basic Part: Yes; Tolerance: ±1%; Voltage Rating: 200V; Temperature Coefficient: ±800ppm/℃; Temperature Rating: -55℃~+155℃; ComponentLink1Description: Datasheet; ComponentLink1URL: https://wmsc.lcsc.com/wmsc/upload/file/pdf/v2/lcsc/2205312300_UNI-ROYAL-Uniroyal-Elec-25121WF470MT4E_C406935.pdf; ComponentLink2Description: JLCPCB Part URL; ComponentLink2URL: https://jlcpcb.com/partdetail/C406935
pins: 1, 2
1 alternate drawing of the same symbol

## 25121WF475JT4E
designator R?  Resistance: 47.5Ω  (hidden comment: *)
Resistor, 47.5Ω, ±1%, 1W, 200V, ±100ppm/℃, -55℃~+155℃, SMD 2512; Manufacturer: Uniroyal; Manufacturer Part Number: 25121WF475JT4E; Supplier 1: LCSC; Supplier Part Number 1: C421546; JLCPCB Part Number: C421546; Power Rating: 1W; Category: Resistors; Package Size: 2512; JLCPCB Basic Part: Yes; Tolerance: ±1%; Voltage Rating: 200V; Temperature Coefficient: ±100ppm/℃; Temperature Rating: -55℃~+155℃; ComponentLink1Description: Datasheet; ComponentLink1URL: https://wmsc.lcsc.com/wmsc/upload/file/pdf/v2/lcsc/2205312000_UNI-ROYAL-Uniroyal-Elec-25121WF475JT4E_C421546.pdf; ComponentLink2Description: JLCPCB Part URL; ComponentLink2URL: https://jlcpcb.com/partdetail/C421546
pins: 1, 2
1 alternate drawing of the same symbol

## 25121WF499JT4E
designator R?  Resistance: 49.9Ω  (hidden comment: *)
Resistor, 49.9Ω, ±1%, 1W, 200V, ±200ppm/℃, -55℃~+155℃, SMD 2512; Manufacturer: Uniroyal; Manufacturer Part Number: 25121WF499JT4E; Supplier 1: LCSC; Supplier Part Number 1: C25487; JLCPCB Part Number: C25487; Power Rating: 1W; Category: Resistors; Package Size: 2512; JLCPCB Basic Part: Yes; Tolerance: ±1%; Voltage Rating: 200V; Temperature Coefficient: ±200ppm/℃; Temperature Rating: -55℃~+155℃; ComponentLink1Description: Datasheet; ComponentLink1URL: https://wmsc.lcsc.com/wmsc/upload/file/pdf/v2/lcsc/2205311845_UNI-ROYAL-Uniroyal-Elec-25121WF499JT4E_C25487.pdf; ComponentLink2Description: JLCPCB Part URL; ComponentLink2URL: https://jlcpcb.com/partdetail/C25487
pins: 1, 2
1 alternate drawing of the same symbol

## 25121WF499KT4E
designator R?  Resistance: 4.99Ω  (hidden comment: *)
Resistor, 4.99Ω, ±1%, 1W, 200V, ±200ppm/℃, -55℃~+155℃, SMD 2512; Manufacturer: Uniroyal; Manufacturer Part Number: 25121WF499KT4E; Supplier 1: LCSC; Supplier Part Number 1: C406933; JLCPCB Part Number: C406933; Power Rating: 1W; Category: Resistors; Package Size: 2512; JLCPCB Basic Part: Yes; Tolerance: ±1%; Voltage Rating: 200V; Temperature Coefficient: ±200ppm/℃; Temperature Rating: -55℃~+155℃; ComponentLink1Description: Datasheet; ComponentLink1URL: https://wmsc.lcsc.com/wmsc/upload/file/pdf/v2/lcsc/2205312300_UNI-ROYAL-Uniroyal-Elec-25121WF499KT4E_C406933.pdf; ComponentLink2Description: JLCPCB Part URL; ComponentLink2URL: https://jlcpcb.com/partdetail/C406933
pins: 1, 2
1 alternate drawing of the same symbol